# Altium footprint library AOO.PcbLib: 131 footprints (part 8 of 9)
Each footprint in its own frame and in the unit in brackets; x right, y up, seen from the top. Pads: shape width x height; smd on the part's side, far side on the other; paste and mask are expansions set on the pad; w line width, h text height; cw(c..) or ccw(c..) is an arc to the next point about the centre after c.
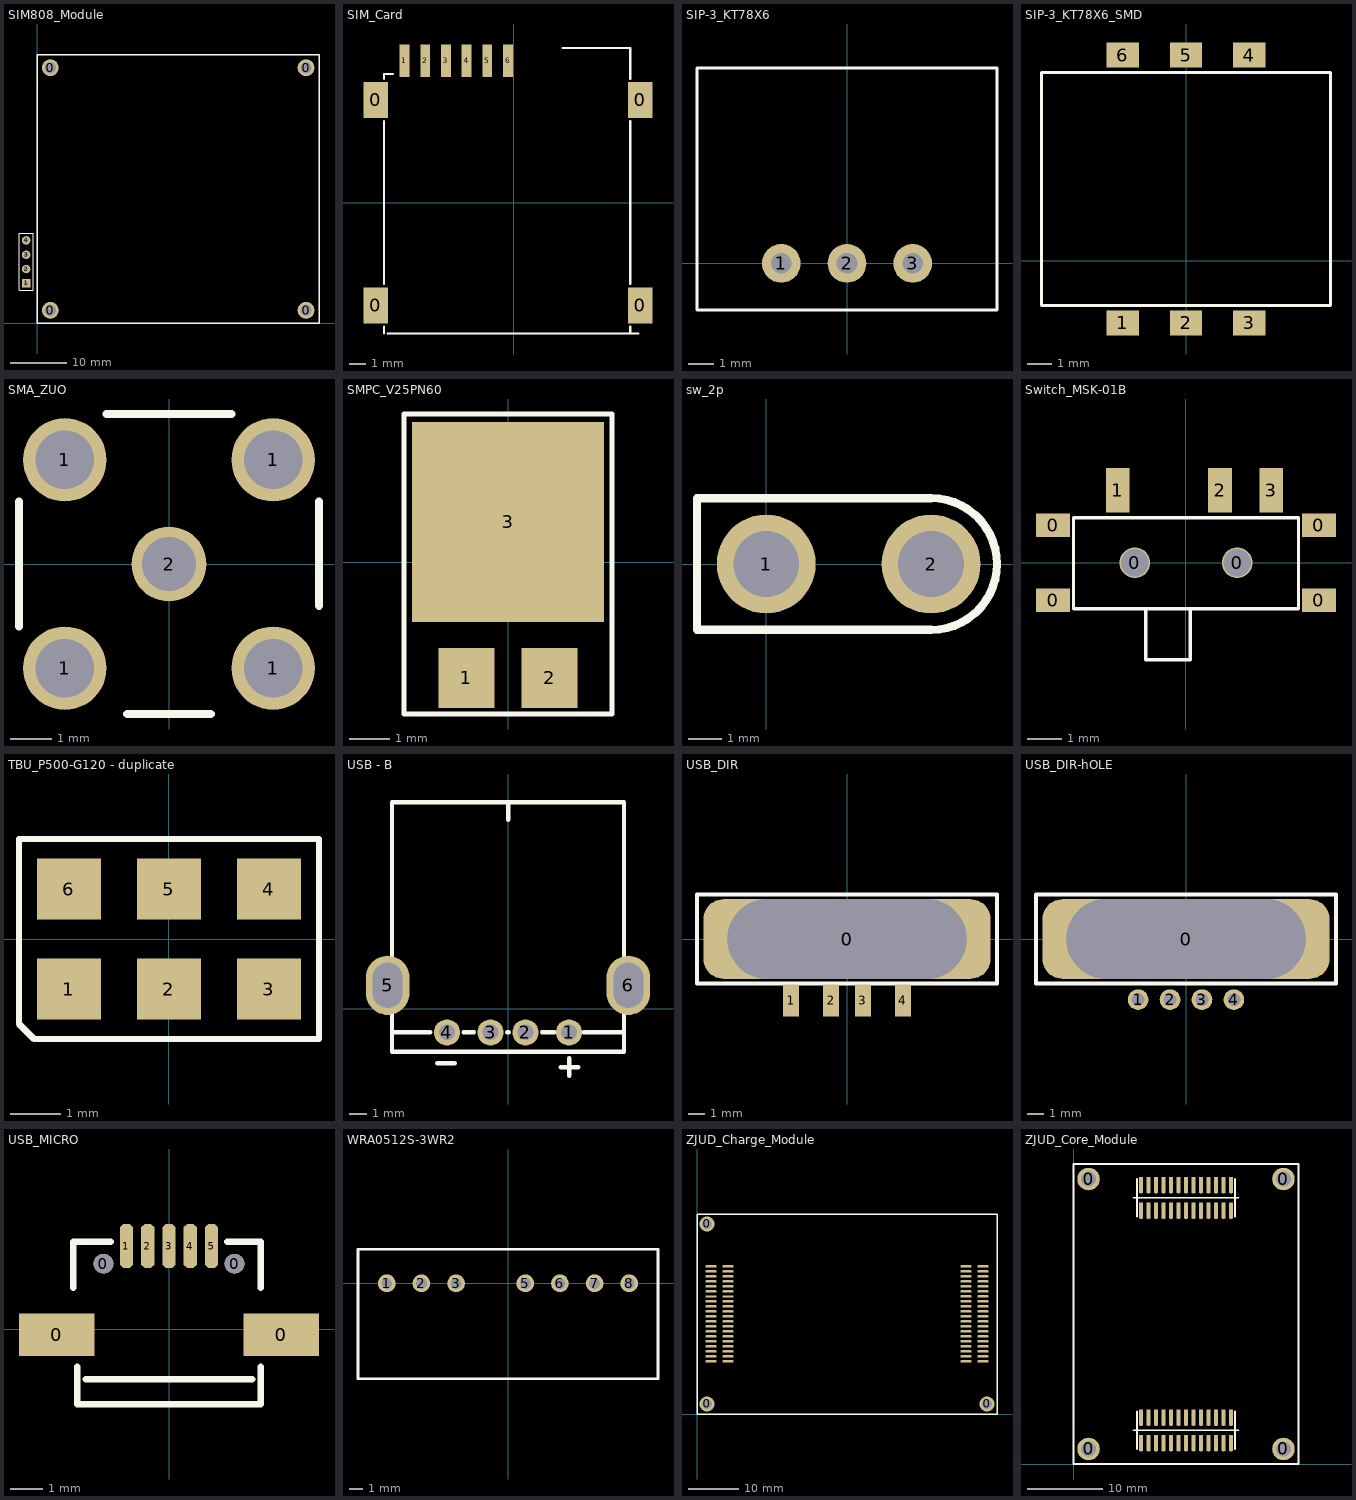
[diagram p7: the footprints below, top view; thin cyan lines are the x and y axes]

## SIM808_Module [mm]
pads (8):
  round 3 hole 2: 0(2.3,2.3) 0(2.3,45.4) 0(47.7,2.3) 0(47.7,45.4)
  rect 1.5x1.5 hole 0.9: 1(-2,7.1)
  round 1.5 hole 0.9: 2(-2,9.64) 3(-2,12.18) 4(-2,14.72)
Top Overlay:
  lines w0.2: -3.27,5.83 -0.73,5.83 -0.73,15.99 -3.27,15.99 -3.27,5.83
  lines w0.254: 0,0 0,47.7 50,47.7 50,0 0,0

## SIM_Card [mm] "SIM_Card"
pads (10):
  rect 1.5x2.2 smd: 0(-8.45,-6.3) 0(-8.45,6.3) 0(7.75,-6.3) 0(7.75,6.3)
  rect 0.6x2 smd: 1(-6.7,8.7) 2(-5.43,8.7) 3(-4.16,8.7) 4(-2.89,8.7) 5(-1.62,8.7) 6(-0.35,8.7)
Top Overlay:
  lines w0.127: -7.95,-8.025 -7.95,-7.6 ; -7.95,-5 -7.95,5 ; -7.95,7.6 -7.95,7.9 -7.4,7.9 ; -7.75,-8.025 7.65,-8.025 ; 3,9.49 7.15,9.49 7.15,7.6 ; 7.15,-8.025 7.15,-7.6 ; 7.15,-5 7.15,5
3D body: height 1.24, standoff 0.01, extent -8.25,-7.96 8.25,9.49

## SIP-3_KT78X6 [mm] "TBU_P500-G120"
pads (3):
  round 1.5 hole 0.8: 1(-2.54,0) 2(0,0) 3(2.54,0)
Top Overlay:
  lines w0.127: -5.8,-1.8 5.8,-1.8 5.8,7.55 -5.8,7.55 -5.8,-1.8

## SIP-3_KT78X6_SMD [mm] "TBU_P500-G120"
pads (6):
  rect 1.3x1 smd: 1(-2.54,-2.5) 2(0,-2.5) 3(2.54,-2.5) 4(2.54,8.25) 5(0,8.25) 6(-2.54,8.25)
Top Overlay:
  lines w0.127: -5.8,-1.8 -5.8,7.55 5.8,7.55 5.8,-1.8 -5.8,-1.8

## SMA_ZUO [mm]
pads (5):
  round 2 hole 1.4: 1(-2.5,-2.5) 1(-2.5,2.5) 1(2.5,-2.5) 1(2.5,2.5)
  round 1.8 hole 1.3: 2(0,0)
Top Overlay:
  lines w0.2: -3.6,-1.5 -3.6,1.5 ; -1.5,3.6 1.5,3.6 ; -1,-3.6 1,-3.6 ; 3.6,-1 3.6,1.5
3D body: height 9.52, standoff -3.98, extent -3.25,-3.25 3.25,3.25

## SMPC_V25PN60 [mm] "1206贴片电阻"
pads (3):
  rect 1.4x1.5 smd: 1(-1.04,-2.9) 2(1.04,-2.9)
  rect 4.8x5 smd: 3(0,1)
Top Overlay:
  lines w0.127: -2.6,-3.8 2.6,-3.8 2.6,3.7 -2.6,3.7 -2.6,-3.8
3D body: height 1.13, standoff 0.02, extent -2.3,-3.25 2.3,3.25

## sw_2p [mm] "sw_2p"
pads (2):
  round 3 hole 2: 1(0,0) 2(5,0)
Top Overlay:
  lines w0.254: -2.1,-2 5,-2 ccw(c5,0) 5,2 -2.1,2 -2.1,-2

## Switch_MSK-01B [mm]
pads (9):
  rect 1x0.7 smd: 0(-3.9,-1.1) 0(-3.9,1.1) 0(3.9,-1.1) 0(3.9,1.1)
  round 0.9 hole 0.8: 0(-1.5,0) 0(1.5,0)
  rect 0.7x1.3 smd: 1(-2,2.127) 2(1,2.127) 3(2.5,2.127)
Top Overlay:
  lines w0.1: -1.175,-1.35 -1.175,-2.85 0.125,-2.85 0.125,-1.35 ; -3.3,-1.35 -3.3,1.325 3.3,1.325 3.3,-1.35 -3.3,-1.35
3D body: height 1.42, standoff -0.48, extent -3.9,-2.85 3.9,2.4

## TBU_P500-G120 - duplicate [mm] "TBU_P500-G120"
pads (6):
  rect 1.275x1.225 smd: 1(-2,-1) 2(0,-1) 3(2,-1) 4(2,1) 5(0,1) 6(-2,1)
Top Overlay:
  lines w0.127: -3,-1.7 -3,2 3,2 3,-2 -2.7,-2 -3,-1.7
3D body: height 0.79, standoff 0.02, extent -3,-2 3,2

## USB - B [mm]
pads (6):
  round 1.5 hole 0.9: 1(3.5,-1.35) 2(1,-1.35) 3(-1,-1.35) 4(-3.5,-1.35)
  oval 2.5x3.4 hole 1.7 slot 2.6 at 90 deg: 5(-6.9,1.35) 6(6.9,1.35)
Top Overlay:
  lines w0.254: -6.65,-1.35 -4.45,-1.35 ; -4.06,-3.12 -3.06,-3.12 ; -2.55,-1.35 -1.95,-1.35 ; -0.05,-1.35 0.05,-1.35 ; 0.01,10.85 0.01,11.85 ; 1.95,-1.35 2.65,-1.35 ; 3.02,-3.34 4.02,-3.34 ; 3.52,-3.84 3.52,-2.84 ; 4.35,-1.35 6.65,-1.35 ; -6.65,-2.45 -6.65,11.85 6.65,11.85 6.65,-2.45 -6.65,-2.45
3D body: height 7.55, standoff -3.3, extent -7.895,-2.45 7.905,11.71

## USB_DIR [mm]
pads (5):
  rrect50% 18x5 hole 5 slot 15 at 0 deg: 0(0,0)
  rect 1x2 smd: 1(-3.5,-3.85) 2(-1,-3.85) 3(1,-3.85) 4(3.5,-3.85)
Top Overlay:
  lines w0.254: -9.4,-2.8 -9.4,2.8 9.4,2.8 9.4,-2.8 -9.4,-2.8
3D body: height 9.42, standoff -10.59, extent -7.005,-2.3 7.005,2.2

## USB_DIR-hOLE [mm]
pads (5):
  rrect50% 18x5 hole 5 slot 15 at 0 deg: 0(0,0)
  round 1.3 hole 0.8: 1(-3,-3.8) 2(-1,-3.8) 3(1,-3.8) 4(3,-3.8)
Top Overlay:
  lines w0.254: -9.4,-2.8 9.4,-2.8 9.4,2.8 -9.4,2.8 -9.4,-2.8
3D body: height 9.42, standoff -10.59, extent -7.005,-2.3 7.005,2.2

## USB_MICRO [mm] "USB方孔"
height 8
pads (9):
  rect 2.3x1.3 smd: 0(-3.429,-0.175) 0(3.429,-0.175)
  round 0.6 hole 0.6: 0(-2,2) 0(2,2)
  oct 0.4x1.35 smd: 1(-1.3,2.54) 2(-0.65,2.54) 3(0,2.54) 4(0.65,2.54) 5(1.3,2.54)
Top Overlay:
  lines w0.2: -2.921,1.27 -2.921,2.667 -1.778,2.667 ; -2.794,-1.143 -2.794,-2.286 2.794,-2.286 2.794,-1.143 ; -2.54,-1.524 2.54,-1.524 ; 1.778,2.667 2.794,2.667 2.794,1.27
3D body: height 2.62, standoff -0.38, extent -4.4,-2.45 4.4,2.65

## WRA0512S-3WR2 [mm]
pads (7):
  round 1.3 hole 0.8: 1(-8.89,0) 2(-6.35,0) 3(-3.81,0) 5(1.27,0) 6(3.81,0) 7(6.35,0) 8(8.89,0)
Top Overlay:
  lines w0.2: -11,-7 -11,2.5 11,2.5 11,-7 -11,-7

## ZJUD_Charge_Module [mm]
pads (83):
  round 3 hole 2: 0(2,2) 0(2,38) 0(58,2)
  rrect50% 2.2x0.5 smd: 1(6.2,29.5) 2(2.8,29.5) 3(6.2,28.5) 4(2.8,28.5) 5(6.2,27.5) 6(2.8,27.5) 7(6.2,26.5) 8(2.8,26.5) 9(6.2,25.5) 10(2.8,25.5) 11(6.2,24.5) 12(2.8,24.5) 13(6.2,23.5) 14(2.8,23.5) 15(6.2,22.5) 16(2.8,22.5) 17(6.2,21.5) 18(2.8,21.5) 19(6.2,20.5) 20(2.8,20.5) 21(6.2,19.5) 22(2.8,19.5) 23(6.2,18.5) 24(2.8,18.5) 25(6.2,17.5) 26(2.8,17.5) 27(6.2,16.5) 28(2.8,16.5) 29(6.2,15.5) 30(2.8,15.5) 31(6.2,14.5) 32(2.8,14.5) 33(6.2,13.5) 34(2.8,13.5) 35(6.2,12.5) 36(2.8,12.5) 37(6.2,11.5) 38(2.8,11.5) 39(6.2,10.5) 40(2.8,10.5) 41(57.2,29.5) 42(53.8,29.5) 43(57.2,28.5) 44(53.8,28.5) 45(57.2,27.5) 46(53.8,27.5) 47(57.2,26.5) 48(53.8,26.5) 49(57.2,25.5) 50(53.8,25.5) 51(57.2,24.5) 52(53.8,24.5) 53(57.2,23.5) 54(53.8,23.5) 55(57.2,22.5) 56(53.8,22.5) 57(57.2,21.5) 58(53.8,21.5) 59(57.2,20.5) 60(53.8,20.5) 61(57.2,19.5) 62(53.8,19.5) 63(57.2,18.5) 64(53.8,18.5) 65(57.2,17.5) 66(53.8,17.5) 67(57.2,16.5) 68(53.8,16.5) 69(57.2,15.5) 70(53.8,15.5) 71(57.2,14.5) 72(53.8,14.5) 73(57.2,13.5) 74(53.8,13.5) 75(57.2,12.5) 76(53.8,12.5) 77(57.2,11.5) 78(53.8,11.5) 79(57.2,10.5) 80(53.8,10.5)
Top Overlay:
  lines w0.254: 0,0 0,40 30,40 60,40 60,0 30,0 0,0
Bottom Overlay:
  lines w0.254: 2,9.96 7,9.96 ; 2,30.04 7,30.04 ; 4.5,9.6 4.5,30.5 ; 53,9.96 58,9.96 ; 53,30.04 58,30.04 ; 55.5,9.6 55.5,30.5

## ZJUD_Core_Module [mm]
pads (56):
  round 3 hole 2: 0(2,2) 0(2,38) 0(28,2) 0(28,38)
  rrect50% 0.5x2.2 smd: 1(9,37.2) 2(9,33.8) 3(10,37.2) 4(10,33.8) 5(11,37.2) 6(11,33.8) 7(12,37.2) 8(12,33.8) 9(13,37.2) 10(13,33.8) 11(14,37.2) 12(14,33.8) 13(15,37.2) 14(15,33.8) 15(16,37.2) 16(16,33.8) 17(17,37.2) 18(17,33.8) 19(18,37.2) 20(18,33.8) 21(19,37.2) 22(19,33.8) 23(20,37.2) 24(20,33.8) 25(21,37.2) 26(21,33.8) 31(9,6.2) 32(9,2.8) 33(10,6.2) 34(10,2.8) 35(11,6.2) 36(11,2.8) 37(12,6.2) 38(12,2.8) 39(13,6.2) 40(13,2.8) 41(14,6.2) 42(14,2.8) 43(15,6.2) 44(15,2.8) 45(16,6.2) 46(16,2.8) 47(17,6.2) 48(17,2.8) 49(18,6.2) 50(18,2.8) 51(19,6.2) 52(19,2.8) 53(20,6.2) 54(20,2.8) 55(21,6.2) 56(21,2.8)
Top Overlay:
  lines w0.254: 8,4.5 22,4.5 ; 8,35.5 22,35.5 ; 8.46,2 8.46,7 ; 8.46,33 8.46,38 ; 21.54,2 21.54,7 ; 21.54,33 21.54,38 ; 0,0 0,40 30,40 30,0 0,0
3D body: height 8.62, standoff 0.02, extent 0,0 30,40